# Altium footprint library 全库.PcbLib: 967 footprints (part 23 of 61)
Each footprint in its own frame and in the unit in brackets; x right, y up, seen from the top. Pads: shape width x height; smd on the part's side, far side on the other; paste and mask are expansions set on the pad; w line width, h text height; cw(c..) or ccw(c..) is an arc to the next point about the centre after c.
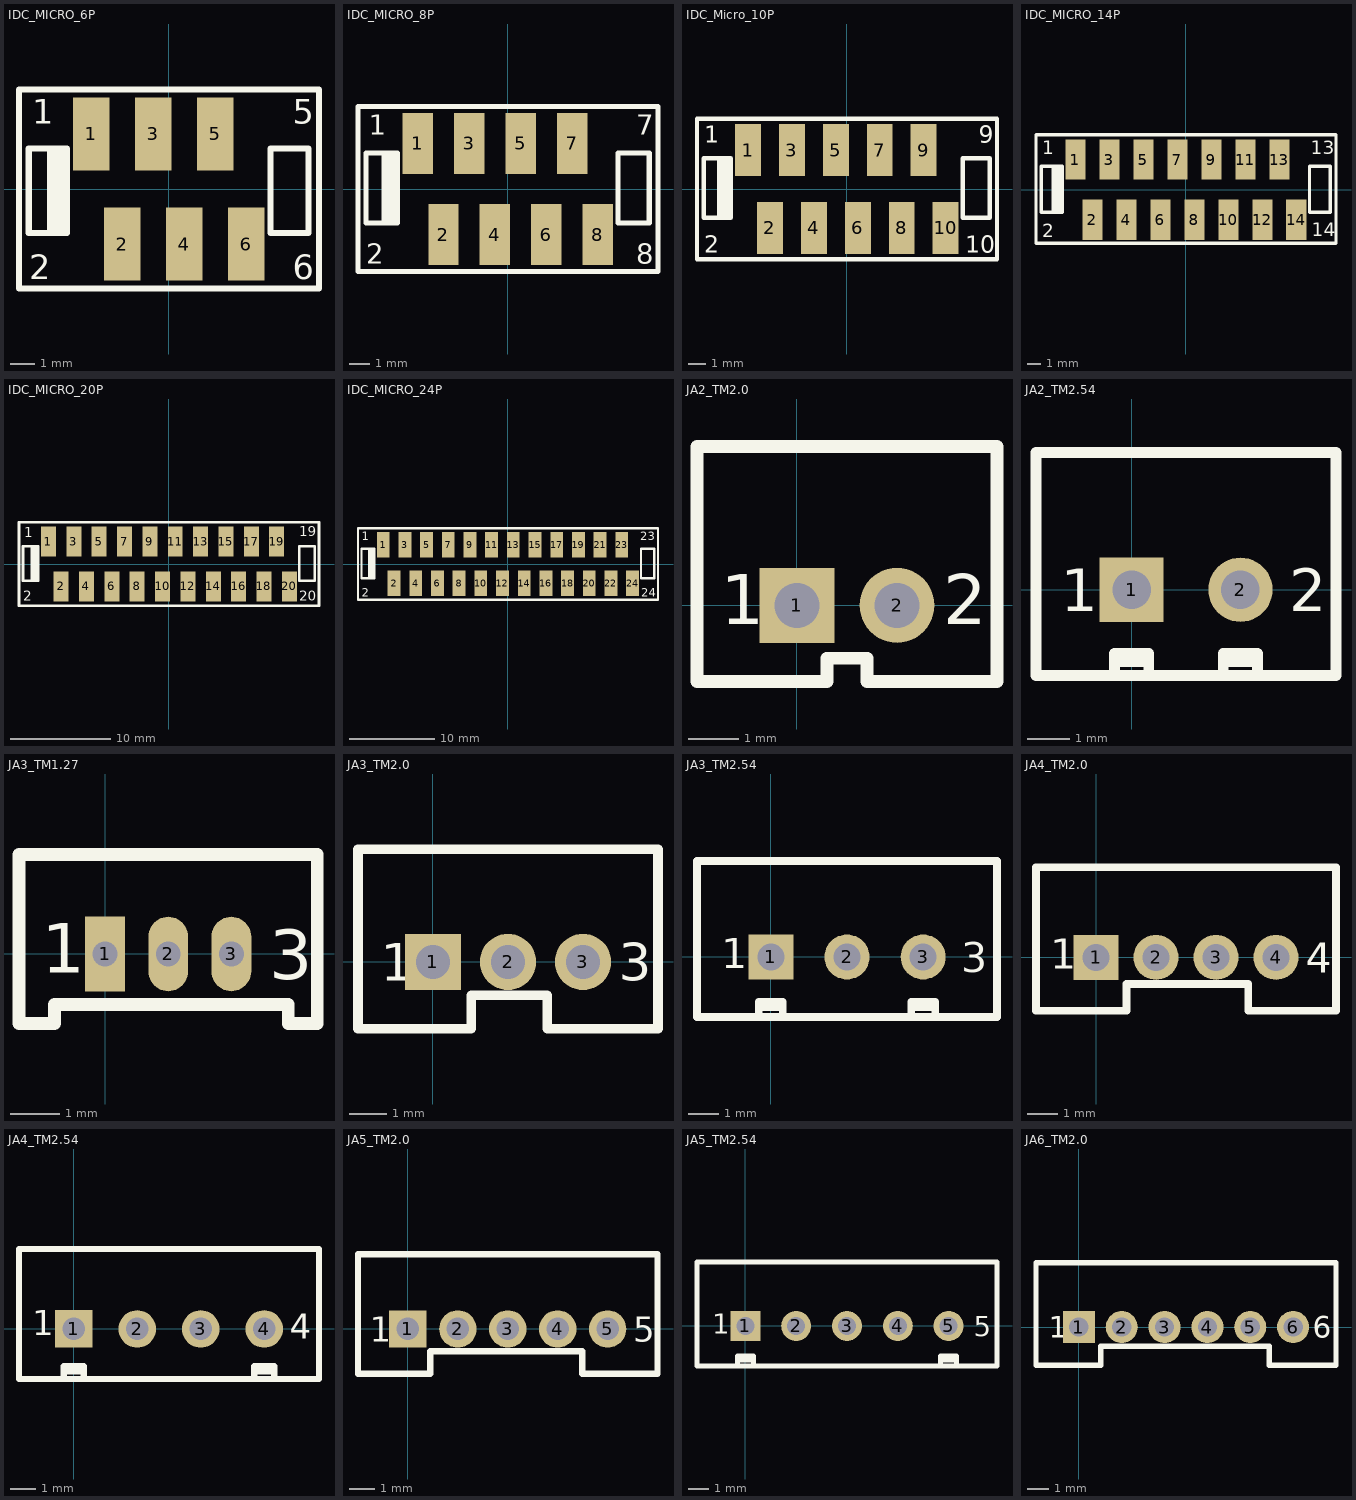
[diagram p22: the footprints below, top view; thin cyan lines are the x and y axes]

## IDC_MICRO_6P [mm]
pads (6):
  rect 1.5x3 smd: 1(-3.175,2.25) 2(-1.905,-2.25) 3(-0.635,2.25) 4(0.635,-2.25) 5(1.905,2.25) 6(3.175,-2.25)
Top Overlay:
  rectangle: -4.975,-1.799 -4.175,1.651
  lines w0.254: -6.125,-4.064 -6.125,4.064 6.145,4.064 6.145,-4.064 -6.125,-4.064 ; -5.725,-1.799 -5.725,1.651 -4.175,1.651 -4.175,-1.799 -5.725,-1.799 ; 4.165,-1.799 5.715,-1.799 5.715,1.651 4.165,1.651 4.165,-1.799
  text "1" at -5.588,2.667 h1
  text "2" at -5.715,-3.683 h1
  text "5" at 5.08,2.667 h1
  text "6" at 5.08,-3.683 h1

## IDC_MICRO_8P [mm] "CA32-V-SMT Micro IDC"
pads (8):
  rect 1.5x3 smd: 1(-4.445,2.25) 2(-3.175,-2.25) 3(-1.905,2.25) 4(-0.635,-2.25) 5(0.635,2.25) 6(1.905,-2.25) 7(3.175,2.25) 8(4.445,-2.25)
Top Overlay:
  rectangle: -6.245,-1.672 -5.445,1.778
  lines w0.254: -7.395,-4.064 -7.395,4.064 7.415,4.064 7.415,-4.064 -7.395,-4.064 ; -6.995,-1.672 -5.445,-1.672 -5.445,1.778 -6.995,1.778 -6.995,-1.672 ; 5.435,-1.672 5.435,1.778 6.985,1.778 6.985,-1.672 5.435,-1.672
  text "1" at -6.858,2.667 h1
  text "2" at -6.985,-3.683 h1
  text "7" at 6.35,2.667 h1
  text "8" at 6.35,-3.683 h1

## IDC_Micro_10P [mm] "CA32-V-SMT Micro IDC"
pads (10):
  rect 1.5x3 smd: 1(-5.715,2.25) 2(-4.445,-2.25) 3(-3.175,2.25) 4(-1.905,-2.25) 5(-0.635,2.25) 6(0.635,-2.25) 7(1.905,2.25) 8(3.175,-2.25) 9(4.445,2.25) 10(5.715,-2.25)
Top Overlay:
  rectangle: -7.515,-1.672 -6.715,1.778
  lines w0.254: -8.665,-4.064 -8.665,4.064 8.685,4.064 8.685,-4.064 -8.665,-4.064 ; -8.265,-1.672 -6.715,-1.672 -6.715,1.778 -8.265,1.778 -8.265,-1.672 ; 6.705,-1.672 6.705,1.778 8.255,1.778 8.255,-1.672 6.705,-1.672
  text "1" at -8.255,2.667 h1
  text "2" at -8.255,-3.683 h1
  text "9" at 7.62,2.667 h1
  text "10" at 6.858,-3.683 h1

## IDC_MICRO_14P [mm] "CA32-V-SMT Micro IDC"
pads (14):
  rect 1.5x3 smd: 1(-8.255,2.25) 2(-6.985,-2.25) 3(-5.715,2.25) 4(-4.445,-2.25) 5(-3.175,2.25) 6(-1.905,-2.25) 7(-0.635,2.25) 8(0.635,-2.25) 9(1.905,2.25) 10(3.175,-2.25) 11(4.445,2.25) 12(5.715,-2.25) 13(6.985,2.25) 14(8.255,-2.25)
Top Overlay:
  rectangle: -10.055,-1.7 -9.255,1.75
  lines w0.254: -11.205,-4 11.225,-4 11.225,4.1 -11.205,4.1 -11.205,-4 ; -10.805,-1.7 -9.255,-1.7 -9.255,1.75 -10.805,1.75 -10.805,-1.7 ; 9.245,-1.7 10.795,-1.7 10.795,1.75 9.245,1.75 9.245,-1.7
  text "14" at 9.395,-3.5 h1
  text "13" at 9.345,2.65 h1
  text "2" at -10.755,-3.55 h1
  text "1" at -10.755,2.65 h1

## IDC_MICRO_20P [mm] "CA32-V-SMT Micro IDC"
pads (20):
  rect 1.5x3 smd: 1(-12.065,2.25) 2(-10.795,-2.25) 3(-9.525,2.25) 4(-8.255,-2.25) 5(-6.985,2.25) 6(-5.715,-2.25) 7(-4.445,2.25) 8(-3.175,-2.25) 9(-1.905,2.25) 10(-0.635,-2.25) 11(0.635,2.25) 12(1.905,-2.25) 13(3.175,2.25) 14(4.445,-2.25) 15(5.715,2.25) 16(6.985,-2.25) 17(8.255,2.25) 18(9.525,-2.25) 19(10.795,2.25) 20(12.065,-2.25)
Top Overlay:
  rectangle: -13.865,-1.672 -13.065,1.778
  lines w0.254: -15.015,-4.191 15.035,-4.191 15.035,4.191 -15.015,4.191 -15.015,-4.191 ; -14.615,-1.672 -14.615,1.778 -13.065,1.778 -13.065,-1.672 -14.615,-1.672 ; 13.055,-1.672 14.605,-1.672 14.605,1.778 13.055,1.778 13.055,-1.672
  text "19" at 13.081,2.794 h1
  text "20" at 13.081,-3.683 h1
  text "2" at -14.605,-3.683 h1
  text "1" at -14.478,2.667 h1

## IDC_MICRO_24P [mm]
pads (24):
  rect 1.5x3 smd: 1(-14.605,2.25) 2(-13.335,-2.25) 3(-12.065,2.25) 4(-10.795,-2.25) 5(-9.525,2.25) 6(-8.255,-2.25) 7(-6.985,2.25) 8(-5.715,-2.25) 9(-4.445,2.25) 10(-3.175,-2.25) 11(-1.905,2.25) 12(-0.635,-2.25) 13(0.635,2.25) 14(1.905,-2.25) 15(3.175,2.25) 16(4.445,-2.25) 17(5.715,2.25) 18(6.985,-2.25) 19(8.255,2.25) 20(9.525,-2.25) 21(10.795,2.25) 22(12.065,-2.25) 23(13.335,2.25) 24(14.605,-2.25)
Top Overlay:
  rectangle: -16.405,-1.672 -15.605,1.778
  lines w0.254: -17.555,-4.191 17.575,-4.191 17.575,4.191 -17.555,4.191 -17.555,-4.191 ; -17.155,-1.672 -15.605,-1.672 -15.605,1.778 -17.155,1.778 -17.155,-1.672 ; 15.595,-1.672 15.595,1.778 17.145,1.778 17.145,-1.672 15.595,-1.672
  text "23" at 15.494,2.794 h1
  text "24" at 15.621,-3.81 h1
  text "2" at -17.145,-3.81 h1
  text "1" at -17.145,2.794 h1

## JA2_TM2.0 [mm]
pads (2):
  rect 1.5x1.5 hole 0.9: 1(0,0)
  round 1.5 hole 0.9: 2(2,0)
Top Overlay:
  lines w0.254: -2,-1.524 -2,3.175 4,3.175 4,-1.524 1.4,-1.524 1.4,-1.061 0.6,-1.061 0.6,-1.524 -2,-1.524
  text "2" at 2.921,-0.381 h1
  text "1" at -1.524,-0.381 h1

## JA2_TM2.54 [mm]
pads (2):
  rect 1.5x1.5 hole 0.9: 1(0,0)
  round 1.5 hole 0.9: 2(2.54,0)
Top Overlay:
  lines w0.254: -0.4,-1.886 -0.4,-1.486 0.4,-1.486 0.4,-1.886 ; -0.4,-1.676 0.4,-1.676 ; 2.14,-1.886 2.14,-1.486 2.94,-1.486 2.94,-1.886 ; 2.14,-1.676 2.94,-1.676 ; -2.23,-2 4.77,-2 4.77,3.2 -2.23,3.2 -2.23,-2
  text "2" at 3.683,-0.508 h1
  text "1" at -1.651,-0.508 h1

## JA3_TM1.27 [mm]
pads (3):
  rect 0.8x1.5 hole 0.5: 1(0,0)
  oval 0.8x1.5 hole 0.5: 2(1.27,0) 3(2.54,0)
Top Overlay:
  lines w0.254: -1.73,-1.397 -1.73,2 4.27,2 4.27,-1.397 3.683,-1.397 3.683,-1.016 -1.016,-1.016 -1.016,-1.397 -1.73,-1.397
  text "3" at 3.302,-0.508 h1
  text "1" at -1.27,-0.381 h1

## JA3_TM2.0 [mm]
pads (3):
  rect 1.5x1.5 hole 0.9: 1(0,0)
  round 1.5 hole 0.9: 2(2,0) 3(4,0)
Top Overlay:
  lines w0.254: -2,2.936 -2,-1.778 1.016,-1.778 1.016,-0.889 3.048,-0.889 3.048,-1.778 6,-1.778 6,3 2,3 -2,3
  text "1" at -1.397,-0.508 h1
  text "3" at 4.953,-0.508 h1

## JA3_TM2.54 [mm]
pads (3):
  rect 1.5x1.5 hole 0.9: 1(0,0)
  round 1.5 hole 0.9: 2(2.54,0) 3(5.08,0)
Top Overlay:
  lines w0.254: -0.4,-1.886 -0.4,-1.486 0.4,-1.486 0.4,-1.886 ; -0.4,-1.676 0.4,-1.676 ; 4.68,-1.886 4.68,-1.486 5.48,-1.486 5.48,-1.886 ; 4.68,-1.676 5.48,-1.676 ; -2.46,-2 -2.46,3.2 7.54,3.2 7.54,-2 -2.46,-2
  text "1" at -1.651,-0.381 h1
  text "3" at 6.35,-0.508 h1

## JA4_TM2.0 [mm]
pads (4):
  rect 1.5x1.5 hole 0.9: 1(0,0)
  round 1.5 hole 0.9: 2(2,0) 3(4,0) 4(6,0)
Top Overlay:
  lines w0.254: -2,2.937 -1.937,3 ; -2,-1.778 1.016,-1.778 1.016,-0.889 5.08,-0.889 5.08,-1.778 8,-1.778 8,3 4,3 -2,3 -2,0 -2,-1.778
  text "4" at 6.985,-0.508 h1
  text "1" at -1.524,-0.381 h1

## JA4_TM2.54 [mm]
pads (4):
  rect 1.5x1.5 hole 0.9: 1(0,0)
  round 1.5 hole 0.9: 2(2.54,0) 3(5.08,0) 4(7.62,0)
Top Overlay:
  lines w0.254: -0.4,-1.896 -0.4,-1.496 0.4,-1.496 0.4,-1.896 ; -0.4,-1.686 0.4,-1.686 ; 7.22,-1.896 7.22,-1.496 8.02,-1.496 8.02,-1.896 ; 7.22,-1.686 8.02,-1.686 ; -2.19,-2 -2.19,3.2 9.81,3.2 9.81,-2 -2.19,-2
  text "4" at 8.636,-0.381 h1
  text "1" at -1.651,-0.254 h1

## JA5_TM2.0 [mm]
pads (5):
  rect 1.5x1.5 hole 0.9: 1(0,0)
  round 1.5 hole 0.9: 2(2,0) 3(4,0) 4(6,0) 5(8,0)
Top Overlay:
  lines w0.254: -2,-1.8 0.889,-1.8 0.889,-0.889 6.985,-0.889 6.985,-1.8 10,-1.8 10,3 -2,3 -2,-1.8
  text "1" at -1.524,-0.508 h1
  text "5" at 9.017,-0.508 h1

## JA5_TM2.54 [mm]
pads (5):
  rect 1.5x1.5 hole 0.9: 1(0,0)
  round 1.5 hole 0.9: 2(2.54,0) 3(5.08,0) 4(7.62,0) 5(10.16,0)
Top Overlay:
  lines w0.254: -0.4,-1.896 -0.4,-1.496 0.4,-1.496 0.4,-1.896 ; -0.4,-1.686 0.4,-1.686 ; 9.76,-1.896 9.76,-1.496 10.56,-1.496 10.56,-1.896 ; 9.76,-1.686 10.56,-1.686 ; -2.42,-2 -2.42,3.2 12.58,3.2 12.58,-2 -2.42,-2
  text "5" at 11.43,-0.508 h1
  text "1" at -1.651,-0.381 h1

## JA6_TM2.0 [mm]
pads (6):
  rect 1.5x1.5 hole 0.9: 1(0,0)
  round 1.5 hole 0.9: 2(2,0) 3(4,0) 4(6,0) 5(8,0) 6(10,0)
Top Overlay:
  lines w0.254: 12,2.967 12,-1.778 8.89,-1.778 8.89,-0.889 1.016,-0.889 1.016,-1.778 -2,-1.778 -2,3 2,3 12,3
  text "1" at -1.397,-0.508 h1
  text "6" at 10.922,-0.508 h1